# Altium footprint library ST封装.PcbLib: 1336 footprints (part 85 of 109)
Each footprint in its own frame and in the unit in brackets; x right, y up, seen from the top. Pads: shape width x height; smd on the part's side, far side on the other; paste and mask are expansions set on the pad; w line width, h text height; cw(c..) or ccw(c..) is an arc to the next point about the centre after c.
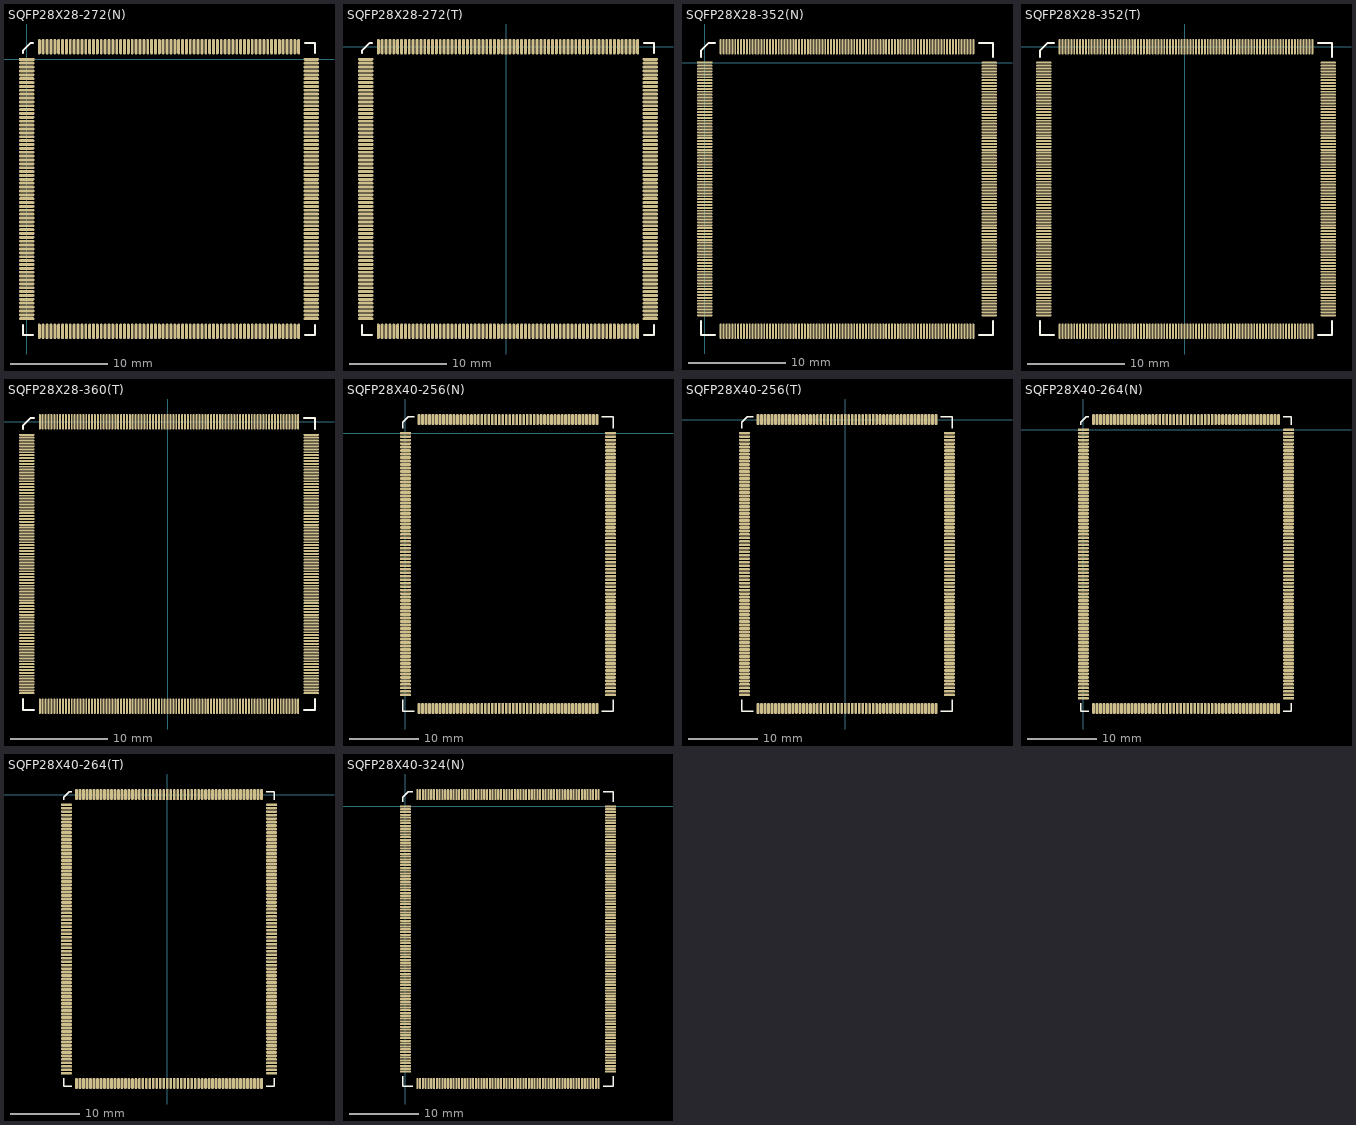
[diagram p84: the footprints below, top view; thin cyan lines are the x and y axes]

## SQFP28X28-272(N) [mm]
pads (272):
  rect 1.6x0.3 smd: 1(0,0)
  oval 1.6x0.3 smd: 2(0,-0.4) 3(0,-0.8) 4(0,-1.2) 5(0,-1.6) 6(0,-2) 7(0,-2.4) 8(0,-2.8) 9(0,-3.2) 10(0,-3.6) 11(0,-4) 12(0,-4.4) 13(0,-4.8) 14(0,-5.2) 15(0,-5.6) 16(0,-6) 17(0,-6.4) 18(0,-6.8) 19(0,-7.2) 20(0,-7.6) 21(0,-8) 22(0,-8.4) 23(0,-8.8) 24(0,-9.2) 25(0,-9.6) 26(0,-10) 27(0,-10.4) 28(0,-10.8) 29(0,-11.2) 30(0,-11.6) 31(0,-12) 32(0,-12.4) 33(0,-12.8) 34(0,-13.2) 35(0,-13.6) 36(0,-14) 37(0,-14.4) 38(0,-14.8) 39(0,-15.2) 40(0,-15.6) 41(0,-16) 42(0,-16.4) 43(0,-16.8) 44(0,-17.2) 45(0,-17.6) 46(0,-18) 47(0,-18.4) 48(0,-18.8) 49(0,-19.2) 50(0,-19.6) 51(0,-20) 52(0,-20.4) 53(0,-20.8) 54(0,-21.2) 55(0,-21.6) 56(0,-22) 57(0,-22.4) 58(0,-22.8) 59(0,-23.2) 60(0,-23.6) 61(0,-24) 62(0,-24.4) 63(0,-24.8) 64(0,-25.2) 65(0,-25.6) 66(0,-26) 67(0,-26.4) 68(0,-26.8) 137(29.4,-26.8) 138(29.4,-26.4) 139(29.4,-26) 140(29.4,-25.6) 141(29.4,-25.2) 142(29.4,-24.8) 143(29.4,-24.4) 144(29.4,-24) 145(29.4,-23.6) 146(29.4,-23.2) 147(29.4,-22.8) 148(29.4,-22.4) 149(29.4,-22) 150(29.4,-21.6) 151(29.4,-21.2) 152(29.4,-20.8) 153(29.4,-20.4) 154(29.4,-20) 155(29.4,-19.6) 156(29.4,-19.2) 157(29.4,-18.8) 158(29.4,-18.4) 159(29.4,-18) 160(29.4,-17.6) 161(29.4,-17.2) 162(29.4,-16.8) 163(29.4,-16.4) 164(29.4,-16) 165(29.4,-15.6) 166(29.4,-15.2) 167(29.4,-14.8) 168(29.4,-14.4) 169(29.4,-14) 170(29.4,-13.6) 171(29.4,-13.2) 172(29.4,-12.8) 173(29.4,-12.4) 174(29.4,-12) 175(29.4,-11.6) 176(29.4,-11.2) 177(29.4,-10.8) 178(29.4,-10.4) 179(29.4,-10) 180(29.4,-9.6) 181(29.4,-9.2) 182(29.4,-8.8) 183(29.4,-8.4) 184(29.4,-8) 185(29.4,-7.6) 186(29.4,-7.2) 187(29.4,-6.8) 188(29.4,-6.4) 189(29.4,-6) 190(29.4,-5.6) 191(29.4,-5.2) 192(29.4,-4.8) 193(29.4,-4.4) 194(29.4,-4) 195(29.4,-3.6) 196(29.4,-3.2) 197(29.4,-2.8) 198(29.4,-2.4) 199(29.4,-2) 200(29.4,-1.6) 201(29.4,-1.2) 202(29.4,-0.8) 203(29.4,-0.4) 204(29.4,0)
  oval 0.3x1.6 smd: 69(1.3,-28.1) 70(1.7,-28.1) 71(2.1,-28.1) 72(2.5,-28.1) 73(2.9,-28.1) 74(3.3,-28.1) 75(3.7,-28.1) 76(4.1,-28.1) 77(4.5,-28.1) 78(4.9,-28.1) 79(5.3,-28.1) 80(5.7,-28.1) 81(6.1,-28.1) 82(6.5,-28.1) 83(6.9,-28.1) 84(7.3,-28.1) 85(7.7,-28.1) 86(8.1,-28.1) 87(8.5,-28.1) 88(8.9,-28.1) 89(9.3,-28.1) 90(9.7,-28.1) 91(10.1,-28.1) 92(10.5,-28.1) 93(10.9,-28.1) 94(11.3,-28.1) 95(11.7,-28.1) 96(12.1,-28.1) 97(12.5,-28.1) 98(12.9,-28.1) 99(13.3,-28.1) 100(13.7,-28.1) 101(14.1,-28.1) 102(14.5,-28.1) 103(14.9,-28.1) 104(15.3,-28.1) 105(15.7,-28.1) 106(16.1,-28.1) 107(16.5,-28.1) 108(16.9,-28.1) 109(17.3,-28.1) 110(17.7,-28.1) 111(18.1,-28.1) 112(18.5,-28.1) 113(18.9,-28.1) 114(19.3,-28.1) 115(19.7,-28.1) 116(20.1,-28.1) 117(20.5,-28.1) 118(20.9,-28.1) 119(21.3,-28.1) 120(21.7,-28.1) 121(22.1,-28.1) 122(22.5,-28.1) 123(22.9,-28.1) 124(23.3,-28.1) 125(23.7,-28.1) 126(24.1,-28.1) 127(24.5,-28.1) 128(24.9,-28.1) 129(25.3,-28.1) 130(25.7,-28.1) 131(26.1,-28.1) 132(26.5,-28.1) 133(26.9,-28.1) 134(27.3,-28.1) 135(27.7,-28.1) 136(28.1,-28.1) 205(28.1,1.3) 206(27.7,1.3) 207(27.3,1.3) 208(26.9,1.3) 209(26.5,1.3) 210(26.1,1.3) 211(25.7,1.3) 212(25.3,1.3) 213(24.9,1.3) 214(24.5,1.3) 215(24.1,1.3) 216(23.7,1.3) 217(23.3,1.3) 218(22.9,1.3) 219(22.5,1.3) 220(22.1,1.3) 221(21.7,1.3) 222(21.3,1.3) 223(20.9,1.3) 224(20.5,1.3) 225(20.1,1.3) 226(19.7,1.3) 227(19.3,1.3) 228(18.9,1.3) 229(18.5,1.3) 230(18.1,1.3) 231(17.7,1.3) 232(17.3,1.3) 233(16.9,1.3) 234(16.5,1.3) 235(16.1,1.3) 236(15.7,1.3) 237(15.3,1.3) 238(14.9,1.3) 239(14.5,1.3) 240(14.1,1.3) 241(13.7,1.3) 242(13.3,1.3) 243(12.9,1.3) 244(12.5,1.3) 245(12.1,1.3) 246(11.7,1.3) 247(11.3,1.3) 248(10.9,1.3) 249(10.5,1.3) 250(10.1,1.3) 251(9.7,1.3) 252(9.3,1.3) 253(8.9,1.3) 254(8.5,1.3) 255(8.1,1.3) 256(7.7,1.3) 257(7.3,1.3) 258(6.9,1.3) 259(6.5,1.3) 260(6.1,1.3) 261(5.7,1.3) 262(5.3,1.3) 263(4.9,1.3) 264(4.5,1.3) 265(4.1,1.3) 266(3.7,1.3) 267(3.3,1.3) 268(2.9,1.3) 269(2.5,1.3) 270(2.1,1.3) 271(1.7,1.3) 272(1.3,1.3)
Top Overlay:
  lines w0.2: -0.4,-27.45 -0.4,-28.5 0.65,-28.5 ; -0.4,0.65 -0.4,0.9 0.4,1.7 0.65,1.7 ; 28.75,-28.5 29.8,-28.5 29.8,-27.45 ; 28.75,1.7 29.8,1.7 29.8,0.65

## SQFP28X28-272(T) [mm]
pads (272):
  rect 0.3x1.6 smd: 1(0,0)
  oval 0.3x1.6 smd: 2(-0.4,0) 3(-0.8,0) 4(-1.2,0) 5(-1.6,0) 6(-2,0) 7(-2.4,0) 8(-2.8,0) 9(-3.2,0) 10(-3.6,0) 11(-4,0) 12(-4.4,0) 13(-4.8,0) 14(-5.2,0) 15(-5.6,0) 16(-6,0) 17(-6.4,0) 18(-6.8,0) 19(-7.2,0) 20(-7.6,0) 21(-8,0) 22(-8.4,0) 23(-8.8,0) 24(-9.2,0) 25(-9.6,0) 26(-10,0) 27(-10.4,0) 28(-10.8,0) 29(-11.2,0) 30(-11.6,0) 31(-12,0) 32(-12.4,0) 33(-12.8,0) 34(-13.2,0) 103(-13.2,-29.4) 104(-12.8,-29.4) 105(-12.4,-29.4) 106(-12,-29.4) 107(-11.6,-29.4) 108(-11.2,-29.4) 109(-10.8,-29.4) 110(-10.4,-29.4) 111(-10,-29.4) 112(-9.6,-29.4) 113(-9.2,-29.4) 114(-8.8,-29.4) 115(-8.4,-29.4) 116(-8,-29.4) 117(-7.6,-29.4) 118(-7.2,-29.4) 119(-6.8,-29.4) 120(-6.4,-29.4) 121(-6,-29.4) 122(-5.6,-29.4) 123(-5.2,-29.4) 124(-4.8,-29.4) 125(-4.4,-29.4) 126(-4,-29.4) 127(-3.6,-29.4) 128(-3.2,-29.4) 129(-2.8,-29.4) 130(-2.4,-29.4) 131(-2,-29.4) 132(-1.6,-29.4) 133(-1.2,-29.4) 134(-0.8,-29.4) 135(-0.4,-29.4) 136(0,-29.4) 137(0.4,-29.4) 138(0.8,-29.4) 139(1.2,-29.4) 140(1.6,-29.4) 141(2,-29.4) 142(2.4,-29.4) 143(2.8,-29.4) 144(3.2,-29.4) 145(3.6,-29.4) 146(4,-29.4) 147(4.4,-29.4) 148(4.8,-29.4) 149(5.2,-29.4) 150(5.6,-29.4) 151(6,-29.4) 152(6.4,-29.4) 153(6.8,-29.4) 154(7.2,-29.4) 155(7.6,-29.4) 156(8,-29.4) 157(8.4,-29.4) 158(8.8,-29.4) 159(9.2,-29.4) 160(9.6,-29.4) 161(10,-29.4) 162(10.4,-29.4) 163(10.8,-29.4) 164(11.2,-29.4) 165(11.6,-29.4) 166(12,-29.4) 167(12.4,-29.4) 168(12.8,-29.4) 169(13.2,-29.4) 170(13.6,-29.4) 239(13.6,0) 240(13.2,0) 241(12.8,0) 242(12.4,0) 243(12,0) 244(11.6,0) 245(11.2,0) 246(10.8,0) 247(10.4,0) 248(10,0) 249(9.6,0) 250(9.2,0) 251(8.8,0) 252(8.4,0) 253(8,0) 254(7.6,0) 255(7.2,0) 256(6.8,0) 257(6.4,0) 258(6,0) 259(5.6,0) 260(5.2,0) 261(4.8,0) 262(4.4,0) 263(4,0) 264(3.6,0) 265(3.2,0) 266(2.8,0) 267(2.4,0) 268(2,0) 269(1.6,0) 270(1.2,0) 271(0.8,0) 272(0.4,0)
  oval 1.6x0.3 smd: 35(-14.5,-1.3) 36(-14.5,-1.7) 37(-14.5,-2.1) 38(-14.5,-2.5) 39(-14.5,-2.9) 40(-14.5,-3.3) 41(-14.5,-3.7) 42(-14.5,-4.1) 43(-14.5,-4.5) 44(-14.5,-4.9) 45(-14.5,-5.3) 46(-14.5,-5.7) 47(-14.5,-6.1) 48(-14.5,-6.5) 49(-14.5,-6.9) 50(-14.5,-7.3) 51(-14.5,-7.7) 52(-14.5,-8.1) 53(-14.5,-8.5) 54(-14.5,-8.9) 55(-14.5,-9.3) 56(-14.5,-9.7) 57(-14.5,-10.1) 58(-14.5,-10.5) 59(-14.5,-10.9) 60(-14.5,-11.3) 61(-14.5,-11.7) 62(-14.5,-12.1) 63(-14.5,-12.5) 64(-14.5,-12.9) 65(-14.5,-13.3) 66(-14.5,-13.7) 67(-14.5,-14.1) 68(-14.5,-14.5) 69(-14.5,-14.9) 70(-14.5,-15.3) 71(-14.5,-15.7) 72(-14.5,-16.1) 73(-14.5,-16.5) 74(-14.5,-16.9) 75(-14.5,-17.3) 76(-14.5,-17.7) 77(-14.5,-18.1) 78(-14.5,-18.5) 79(-14.5,-18.9) 80(-14.5,-19.3) 81(-14.5,-19.7) 82(-14.5,-20.1) 83(-14.5,-20.5) 84(-14.5,-20.9) 85(-14.5,-21.3) 86(-14.5,-21.7) 87(-14.5,-22.1) 88(-14.5,-22.5) 89(-14.5,-22.9) 90(-14.5,-23.3) 91(-14.5,-23.7) 92(-14.5,-24.1) 93(-14.5,-24.5) 94(-14.5,-24.9) 95(-14.5,-25.3) 96(-14.5,-25.7) 97(-14.5,-26.1) 98(-14.5,-26.5) 99(-14.5,-26.9) 100(-14.5,-27.3) 101(-14.5,-27.7) 102(-14.5,-28.1) 171(14.9,-28.1) 172(14.9,-27.7) 173(14.9,-27.3) 174(14.9,-26.9) 175(14.9,-26.5) 176(14.9,-26.1) 177(14.9,-25.7) 178(14.9,-25.3) 179(14.9,-24.9) 180(14.9,-24.5) 181(14.9,-24.1) 182(14.9,-23.7) 183(14.9,-23.3) 184(14.9,-22.9) 185(14.9,-22.5) 186(14.9,-22.1) 187(14.9,-21.7) 188(14.9,-21.3) 189(14.9,-20.9) 190(14.9,-20.5) 191(14.9,-20.1) 192(14.9,-19.7) 193(14.9,-19.3) 194(14.9,-18.9) 195(14.9,-18.5) 196(14.9,-18.1) 197(14.9,-17.7) 198(14.9,-17.3) 199(14.9,-16.9) 200(14.9,-16.5) 201(14.9,-16.1) 202(14.9,-15.7) 203(14.9,-15.3) 204(14.9,-14.9) 205(14.9,-14.5) 206(14.9,-14.1) 207(14.9,-13.7) 208(14.9,-13.3) 209(14.9,-12.9) 210(14.9,-12.5) 211(14.9,-12.1) 212(14.9,-11.7) 213(14.9,-11.3) 214(14.9,-10.9) 215(14.9,-10.5) 216(14.9,-10.1) 217(14.9,-9.7) 218(14.9,-9.3) 219(14.9,-8.9) 220(14.9,-8.5) 221(14.9,-8.1) 222(14.9,-7.7) 223(14.9,-7.3) 224(14.9,-6.9) 225(14.9,-6.5) 226(14.9,-6.1) 227(14.9,-5.7) 228(14.9,-5.3) 229(14.9,-4.9) 230(14.9,-4.5) 231(14.9,-4.1) 232(14.9,-3.7) 233(14.9,-3.3) 234(14.9,-2.9) 235(14.9,-2.5) 236(14.9,-2.1) 237(14.9,-1.7) 238(14.9,-1.3)
Top Overlay:
  lines w0.2: -14.9,-28.75 -14.9,-29.8 -13.85,-29.8 ; -14.9,-0.65 -14.9,-0.4 -14.1,0.4 -13.85,0.4 ; 14.25,-29.8 15.3,-29.8 15.3,-28.75 ; 14.25,0.4 15.3,0.4 15.3,-0.65

## SQFP28X28-352(N) [mm]
pads (352):
  rect 1.6x0.2 smd: 1(0,0)
  oval 1.6x0.2 smd: 2(0,-0.3) 3(0,-0.6) 4(0,-0.9) 5(0,-1.2) 6(0,-1.5) 7(0,-1.8) 8(0,-2.1) 9(0,-2.4) 10(0,-2.7) 11(0,-3) 12(0,-3.3) 13(0,-3.6) 14(0,-3.9) 15(0,-4.2) 16(0,-4.5) 17(0,-4.8) 18(0,-5.1) 19(0,-5.4) 20(0,-5.7) 21(0,-6) 22(0,-6.3) 23(0,-6.6) 24(0,-6.9) 25(0,-7.2) 26(0,-7.5) 27(0,-7.8) 28(0,-8.1) 29(0,-8.4) 30(0,-8.7) 31(0,-9) 32(0,-9.3) 33(0,-9.6) 34(0,-9.9) 35(0,-10.2) 36(0,-10.5) 37(0,-10.8) 38(0,-11.1) 39(0,-11.4) 40(0,-11.7) 41(0,-12) 42(0,-12.3) 43(0,-12.6) 44(0,-12.9) 45(0,-13.2) 46(0,-13.5) 47(0,-13.8) 48(0,-14.1) 49(0,-14.4) 50(0,-14.7) 51(0,-15) 52(0,-15.3) 53(0,-15.6) 54(0,-15.9) 55(0,-16.2) 56(0,-16.5) 57(0,-16.8) 58(0,-17.1) 59(0,-17.4) 60(0,-17.7) 61(0,-18) 62(0,-18.3) 63(0,-18.6) 64(0,-18.9) 65(0,-19.2) 66(0,-19.5) 67(0,-19.8) 68(0,-20.1) 69(0,-20.4) 70(0,-20.7) 71(0,-21) 72(0,-21.3) 73(0,-21.6) 74(0,-21.9) 75(0,-22.2) 76(0,-22.5) 77(0,-22.8) 78(0,-23.1) 79(0,-23.4) 80(0,-23.7) 81(0,-24) 82(0,-24.3) 83(0,-24.6) 84(0,-24.9) 85(0,-25.2) 86(0,-25.5) 87(0,-25.8) 88(0,-26.1) 177(29.4,-26.1) 178(29.4,-25.8) 179(29.4,-25.5) 180(29.4,-25.2) 181(29.4,-24.9) 182(29.4,-24.6) 183(29.4,-24.3) 184(29.4,-24) 185(29.4,-23.7) 186(29.4,-23.4) 187(29.4,-23.1) 188(29.4,-22.8) 189(29.4,-22.5) 190(29.4,-22.2) 191(29.4,-21.9) 192(29.4,-21.6) 193(29.4,-21.3) 194(29.4,-21) 195(29.4,-20.7) 196(29.4,-20.4) 197(29.4,-20.1) 198(29.4,-19.8) 199(29.4,-19.5) 200(29.4,-19.2) 201(29.4,-18.9) 202(29.4,-18.6) 203(29.4,-18.3) 204(29.4,-18) 205(29.4,-17.7) 206(29.4,-17.4) 207(29.4,-17.1) 208(29.4,-16.8) 209(29.4,-16.5) 210(29.4,-16.2) 211(29.4,-15.9) 212(29.4,-15.6) 213(29.4,-15.3) 214(29.4,-15) 215(29.4,-14.7) 216(29.4,-14.4) 217(29.4,-14.1) 218(29.4,-13.8) 219(29.4,-13.5) 220(29.4,-13.2) 221(29.4,-12.9) 222(29.4,-12.6) 223(29.4,-12.3) 224(29.4,-12) 225(29.4,-11.7) 226(29.4,-11.4) 227(29.4,-11.1) 228(29.4,-10.8) 229(29.4,-10.5) 230(29.4,-10.2) 231(29.4,-9.9) 232(29.4,-9.6) 233(29.4,-9.3) 234(29.4,-9) 235(29.4,-8.7) 236(29.4,-8.4) 237(29.4,-8.1) 238(29.4,-7.8) 239(29.4,-7.5) 240(29.4,-7.2) 241(29.4,-6.9) 242(29.4,-6.6) 243(29.4,-6.3) 244(29.4,-6) 245(29.4,-5.7) 246(29.4,-5.4) 247(29.4,-5.1) 248(29.4,-4.8) 249(29.4,-4.5) 250(29.4,-4.2) 251(29.4,-3.9) 252(29.4,-3.6) 253(29.4,-3.3) 254(29.4,-3) 255(29.4,-2.7) 256(29.4,-2.4) 257(29.4,-2.1) 258(29.4,-1.8) 259(29.4,-1.5) 260(29.4,-1.2) 261(29.4,-0.9) 262(29.4,-0.6) 263(29.4,-0.3) 264(29.4,0)
  oval 0.2x1.6 smd: 89(1.65,-27.75) 90(1.95,-27.75) 91(2.25,-27.75) 92(2.55,-27.75) 93(2.85,-27.75) 94(3.15,-27.75) 95(3.45,-27.75) 96(3.75,-27.75) 97(4.05,-27.75) 98(4.35,-27.75) 99(4.65,-27.75) 100(4.95,-27.75) 101(5.25,-27.75) 102(5.55,-27.75) 103(5.85,-27.75) 104(6.15,-27.75) 105(6.45,-27.75) 106(6.75,-27.75) 107(7.05,-27.75) 108(7.35,-27.75) 109(7.65,-27.75) 110(7.95,-27.75) 111(8.25,-27.75) 112(8.55,-27.75) 113(8.85,-27.75) 114(9.15,-27.75) 115(9.45,-27.75) 116(9.75,-27.75) 117(10.05,-27.75) 118(10.35,-27.75) 119(10.65,-27.75) 120(10.95,-27.75) 121(11.25,-27.75) 122(11.55,-27.75) 123(11.85,-27.75) 124(12.15,-27.75) 125(12.45,-27.75) 126(12.75,-27.75) 127(13.05,-27.75) 128(13.35,-27.75) 129(13.65,-27.75) 130(13.95,-27.75) 131(14.25,-27.75) 132(14.55,-27.75) 133(14.85,-27.75) 134(15.15,-27.75) 135(15.45,-27.75) 136(15.75,-27.75) 137(16.05,-27.75) 138(16.35,-27.75) 139(16.65,-27.75) 140(16.95,-27.75) 141(17.25,-27.75) 142(17.55,-27.75) 143(17.85,-27.75) 144(18.15,-27.75) 145(18.45,-27.75) 146(18.75,-27.75) 147(19.05,-27.75) 148(19.35,-27.75) 149(19.65,-27.75) 150(19.95,-27.75) 151(20.25,-27.75) 152(20.55,-27.75) 153(20.85,-27.75) 154(21.15,-27.75) 155(21.45,-27.75) 156(21.75,-27.75) 157(22.05,-27.75) 158(22.35,-27.75) 159(22.65,-27.75) 160(22.95,-27.75) 161(23.25,-27.75) 162(23.55,-27.75) 163(23.85,-27.75) 164(24.15,-27.75) 165(24.45,-27.75) 166(24.75,-27.75) 167(25.05,-27.75) 168(25.35,-27.75) 169(25.65,-27.75) 170(25.95,-27.75) 171(26.25,-27.75) 172(26.55,-27.75) 173(26.85,-27.75) 174(27.15,-27.75) 175(27.45,-27.75) 176(27.75,-27.75) 265(27.75,1.65) 266(27.45,1.65) 267(27.15,1.65) 268(26.85,1.65) 269(26.55,1.65) 270(26.25,1.65) 271(25.95,1.65) 272(25.65,1.65) 273(25.35,1.65) 274(25.05,1.65) 275(24.75,1.65) 276(24.45,1.65) 277(24.15,1.65) 278(23.85,1.65) 279(23.55,1.65) 280(23.25,1.65) 281(22.95,1.65) 282(22.65,1.65) 283(22.35,1.65) 284(22.05,1.65) 285(21.75,1.65) 286(21.45,1.65) 287(21.15,1.65) 288(20.85,1.65) 289(20.55,1.65) 290(20.25,1.65) 291(19.95,1.65) 292(19.65,1.65) 293(19.35,1.65) 294(19.05,1.65) 295(18.75,1.65) 296(18.45,1.65) 297(18.15,1.65) 298(17.85,1.65) 299(17.55,1.65) 300(17.25,1.65) 301(16.95,1.65) 302(16.65,1.65) 303(16.35,1.65) 304(16.05,1.65) 305(15.75,1.65) 306(15.45,1.65) 307(15.15,1.65) 308(14.85,1.65) 309(14.55,1.65) 310(14.25,1.65) 311(13.95,1.65) 312(13.65,1.65) 313(13.35,1.65) 314(13.05,1.65) 315(12.75,1.65) 316(12.45,1.65) 317(12.15,1.65) 318(11.85,1.65) 319(11.55,1.65) 320(11.25,1.65) 321(10.95,1.65) 322(10.65,1.65) 323(10.35,1.65) 324(10.05,1.65) 325(9.75,1.65) 326(9.45,1.65) 327(9.15,1.65) 328(8.85,1.65) 329(8.55,1.65) 330(8.25,1.65) 331(7.95,1.65) 332(7.65,1.65) 333(7.35,1.65) 334(7.05,1.65) 335(6.75,1.65) 336(6.45,1.65) 337(6.15,1.65) 338(5.85,1.65) 339(5.55,1.65) 340(5.25,1.65) 341(4.95,1.65) 342(4.65,1.65) 343(4.35,1.65) 344(4.05,1.65) 345(3.75,1.65) 346(3.45,1.65) 347(3.15,1.65) 348(2.85,1.65) 349(2.55,1.65) 350(2.25,1.65) 351(1.95,1.65) 352(1.65,1.65)
Top Overlay:
  lines w0.2: -0.4,-26.7 -0.4,-28.15 1.05,-28.15 ; -0.4,0.6 -0.4,1.25 0.4,2.05 1.05,2.05 ; 28.35,-28.15 29.8,-28.15 29.8,-26.7 ; 28.35,2.05 29.8,2.05 29.8,0.6

## SQFP28X28-352(T) [mm]
pads (352):
  rect 0.2x1.6 smd: 1(0,0)
  oval 0.2x1.6 smd: 2(-0.3,0) 3(-0.6,0) 4(-0.9,0) 5(-1.2,0) 6(-1.5,0) 7(-1.8,0) 8(-2.1,0) 9(-2.4,0) 10(-2.7,0) 11(-3,0) 12(-3.3,0) 13(-3.6,0) 14(-3.9,0) 15(-4.2,0) 16(-4.5,0) 17(-4.8,0) 18(-5.1,0) 19(-5.4,0) 20(-5.7,0) 21(-6,0) 22(-6.3,0) 23(-6.6,0) 24(-6.9,0) 25(-7.2,0) 26(-7.5,0) 27(-7.8,0) 28(-8.1,0) 29(-8.4,0) 30(-8.7,0) 31(-9,0) 32(-9.3,0) 33(-9.6,0) 34(-9.9,0) 35(-10.2,0) 36(-10.5,0) 37(-10.8,0) 38(-11.1,0) 39(-11.4,0) 40(-11.7,0) 41(-12,0) 42(-12.3,0) 43(-12.6,0) 44(-12.9,0) 133(-12.9,-29.4) 134(-12.6,-29.4) 135(-12.3,-29.4) 136(-12,-29.4) 137(-11.7,-29.4) 138(-11.4,-29.4) 139(-11.1,-29.4) 140(-10.8,-29.4) 141(-10.5,-29.4) 142(-10.2,-29.4) 143(-9.9,-29.4) 144(-9.6,-29.4) 145(-9.3,-29.4) 146(-9,-29.4) 147(-8.7,-29.4) 148(-8.4,-29.4) 149(-8.1,-29.4) 150(-7.8,-29.4) 151(-7.5,-29.4) 152(-7.2,-29.4) 153(-6.9,-29.4) 154(-6.6,-29.4) 155(-6.3,-29.4) 156(-6,-29.4) 157(-5.7,-29.4) 158(-5.4,-29.4) 159(-5.1,-29.4) 160(-4.8,-29.4) 161(-4.5,-29.4) 162(-4.2,-29.4) 163(-3.9,-29.4) 164(-3.6,-29.4) 165(-3.3,-29.4) 166(-3,-29.4) 167(-2.7,-29.4) 168(-2.4,-29.4) 169(-2.1,-29.4) 170(-1.8,-29.4) 171(-1.5,-29.4) 172(-1.2,-29.4) 173(-0.9,-29.4) 174(-0.6,-29.4) 175(-0.3,-29.4) 176(0,-29.4) 177(0.3,-29.4) 178(0.6,-29.4) 179(0.9,-29.4) 180(1.2,-29.4) 181(1.5,-29.4) 182(1.8,-29.4) 183(2.1,-29.4) 184(2.4,-29.4) 185(2.7,-29.4) 186(3,-29.4) 187(3.3,-29.4) 188(3.6,-29.4) 189(3.9,-29.4) 190(4.2,-29.4) 191(4.5,-29.4) 192(4.8,-29.4) 193(5.1,-29.4) 194(5.4,-29.4) 195(5.7,-29.4) 196(6,-29.4) 197(6.3,-29.4) 198(6.6,-29.4) 199(6.9,-29.4) 200(7.2,-29.4) 201(7.5,-29.4) 202(7.8,-29.4) 203(8.1,-29.4) 204(8.4,-29.4) 205(8.7,-29.4) 206(9,-29.4) 207(9.3,-29.4) 208(9.6,-29.4) 209(9.9,-29.4) 210(10.2,-29.4) 211(10.5,-29.4) 212(10.8,-29.4) 213(11.1,-29.4) 214(11.4,-29.4) 215(11.7,-29.4) 216(12,-29.4) 217(12.3,-29.4) 218(12.6,-29.4) 219(12.9,-29.4) 220(13.2,-29.4) 309(13.2,0) 310(12.9,0) 311(12.6,0) 312(12.3,0) 313(12,0) 314(11.7,0) 315(11.4,0) 316(11.1,0) 317(10.8,0) 318(10.5,0) 319(10.2,0) 320(9.9,0) 321(9.6,0) 322(9.3,0) 323(9,0) 324(8.7,0) 325(8.4,0) 326(8.1,0) 327(7.8,0) 328(7.5,0) 329(7.2,0) 330(6.9,0) 331(6.6,0) 332(6.3,0) 333(6,0) 334(5.7,0) 335(5.4,0) 336(5.1,0) 337(4.8,0) 338(4.5,0) 339(4.2,0) 340(3.9,0) 341(3.6,0) 342(3.3,0) 343(3,0) 344(2.7,0) 345(2.4,0) 346(2.1,0) 347(1.8,0) 348(1.5,0) 349(1.2,0) 350(0.9,0) 351(0.6,0) 352(0.3,0)
  oval 1.6x0.2 smd: 45(-14.55,-1.65) 46(-14.55,-1.95) 47(-14.55,-2.25) 48(-14.55,-2.55) 49(-14.55,-2.85) 50(-14.55,-3.15) 51(-14.55,-3.45) 52(-14.55,-3.75) 53(-14.55,-4.05) 54(-14.55,-4.35) 55(-14.55,-4.65) 56(-14.55,-4.95) 57(-14.55,-5.25) 58(-14.55,-5.55) 59(-14.55,-5.85) 60(-14.55,-6.15) 61(-14.55,-6.45) 62(-14.55,-6.75) 63(-14.55,-7.05) 64(-14.55,-7.35) 65(-14.55,-7.65) 66(-14.55,-7.95) 67(-14.55,-8.25) 68(-14.55,-8.55) 69(-14.55,-8.85) 70(-14.55,-9.15) 71(-14.55,-9.45) 72(-14.55,-9.75) 73(-14.55,-10.05) 74(-14.55,-10.35) 75(-14.55,-10.65) 76(-14.55,-10.95) 77(-14.55,-11.25) 78(-14.55,-11.55) 79(-14.55,-11.85) 80(-14.55,-12.15) 81(-14.55,-12.45) 82(-14.55,-12.75) 83(-14.55,-13.05) 84(-14.55,-13.35) 85(-14.55,-13.65) 86(-14.55,-13.95) 87(-14.55,-14.25) 88(-14.55,-14.55) 89(-14.55,-14.85) 90(-14.55,-15.15) 91(-14.55,-15.45) 92(-14.55,-15.75) 93(-14.55,-16.05) 94(-14.55,-16.35) 95(-14.55,-16.65) 96(-14.55,-16.95) 97(-14.55,-17.25) 98(-14.55,-17.55) 99(-14.55,-17.85) 100(-14.55,-18.15) 101(-14.55,-18.45) 102(-14.55,-18.75) 103(-14.55,-19.05) 104(-14.55,-19.35) 105(-14.55,-19.65) 106(-14.55,-19.95) 107(-14.55,-20.25) 108(-14.55,-20.55) 109(-14.55,-20.85) 110(-14.55,-21.15) 111(-14.55,-21.45) 112(-14.55,-21.75) 113(-14.55,-22.05) 114(-14.55,-22.35) 115(-14.55,-22.65) 116(-14.55,-22.95) 117(-14.55,-23.25) 118(-14.55,-23.55) 119(-14.55,-23.85) 120(-14.55,-24.15) 121(-14.55,-24.45) 122(-14.55,-24.75) 123(-14.55,-25.05) 124(-14.55,-25.35) 125(-14.55,-25.65) 126(-14.55,-25.95) 127(-14.55,-26.25) 128(-14.55,-26.55) 129(-14.55,-26.85) 130(-14.55,-27.15) 131(-14.55,-27.45) 132(-14.55,-27.75) 221(14.85,-27.75) 222(14.85,-27.45) 223(14.85,-27.15) 224(14.85,-26.85) 225(14.85,-26.55) 226(14.85,-26.25) 227(14.85,-25.95) 228(14.85,-25.65) 229(14.85,-25.35) 230(14.85,-25.05) 231(14.85,-24.75) 232(14.85,-24.45) 233(14.85,-24.15) 234(14.85,-23.85) 235(14.85,-23.55) 236(14.85,-23.25) 237(14.85,-22.95) 238(14.85,-22.65) 239(14.85,-22.35) 240(14.85,-22.05) 241(14.85,-21.75) 242(14.85,-21.45) 243(14.85,-21.15) 244(14.85,-20.85) 245(14.85,-20.55) 246(14.85,-20.25) 247(14.85,-19.95) 248(14.85,-19.65) 249(14.85,-19.35) 250(14.85,-19.05) 251(14.85,-18.75) 252(14.85,-18.45) 253(14.85,-18.15) 254(14.85,-17.85) 255(14.85,-17.55) 256(14.85,-17.25) 257(14.85,-16.95) 258(14.85,-16.65) 259(14.85,-16.35) 260(14.85,-16.05) 261(14.85,-15.75) 262(14.85,-15.45) 263(14.85,-15.15) 264(14.85,-14.85) 265(14.85,-14.55) 266(14.85,-14.25) 267(14.85,-13.95) 268(14.85,-13.65) 269(14.85,-13.35) 270(14.85,-13.05) 271(14.85,-12.75) 272(14.85,-12.45) 273(14.85,-12.15) 274(14.85,-11.85) 275(14.85,-11.55) 276(14.85,-11.25) 277(14.85,-10.95) 278(14.85,-10.65) 279(14.85,-10.35) 280(14.85,-10.05) 281(14.85,-9.75) 282(14.85,-9.45) 283(14.85,-9.15) 284(14.85,-8.85) 285(14.85,-8.55) 286(14.85,-8.25) 287(14.85,-7.95) 288(14.85,-7.65) 289(14.85,-7.35) 290(14.85,-7.05) 291(14.85,-6.75) 292(14.85,-6.45) 293(14.85,-6.15) 294(14.85,-5.85) 295(14.85,-5.55) 296(14.85,-5.25) 297(14.85,-4.95) 298(14.85,-4.65) 299(14.85,-4.35) 300(14.85,-4.05) 301(14.85,-3.75) 302(14.85,-3.45) 303(14.85,-3.15) 304(14.85,-2.85) 305(14.85,-2.55) 306(14.85,-2.25) 307(14.85,-1.95) 308(14.85,-1.65)
Top Overlay:
  lines w0.2: -14.95,-28.35 -14.95,-29.8 -13.5,-29.8 ; -14.95,-1.05 -14.95,-0.4 -14.15,0.4 -13.5,0.4 ; 13.8,-29.8 15.25,-29.8 15.25,-28.35 ; 13.8,0.4 15.25,0.4 15.25,-1.05
